# Altium footprint library Standard.PcbLib: 154 footprints (part 4 of 10)
Each footprint in its own frame and in the unit in brackets; x right, y up, seen from the top. Pads: shape width x height; smd on the part's side, far side on the other; paste and mask are expansions set on the pad; w line width, h text height; cw(c..) or ccw(c..) is an arc to the next point about the centre after c.
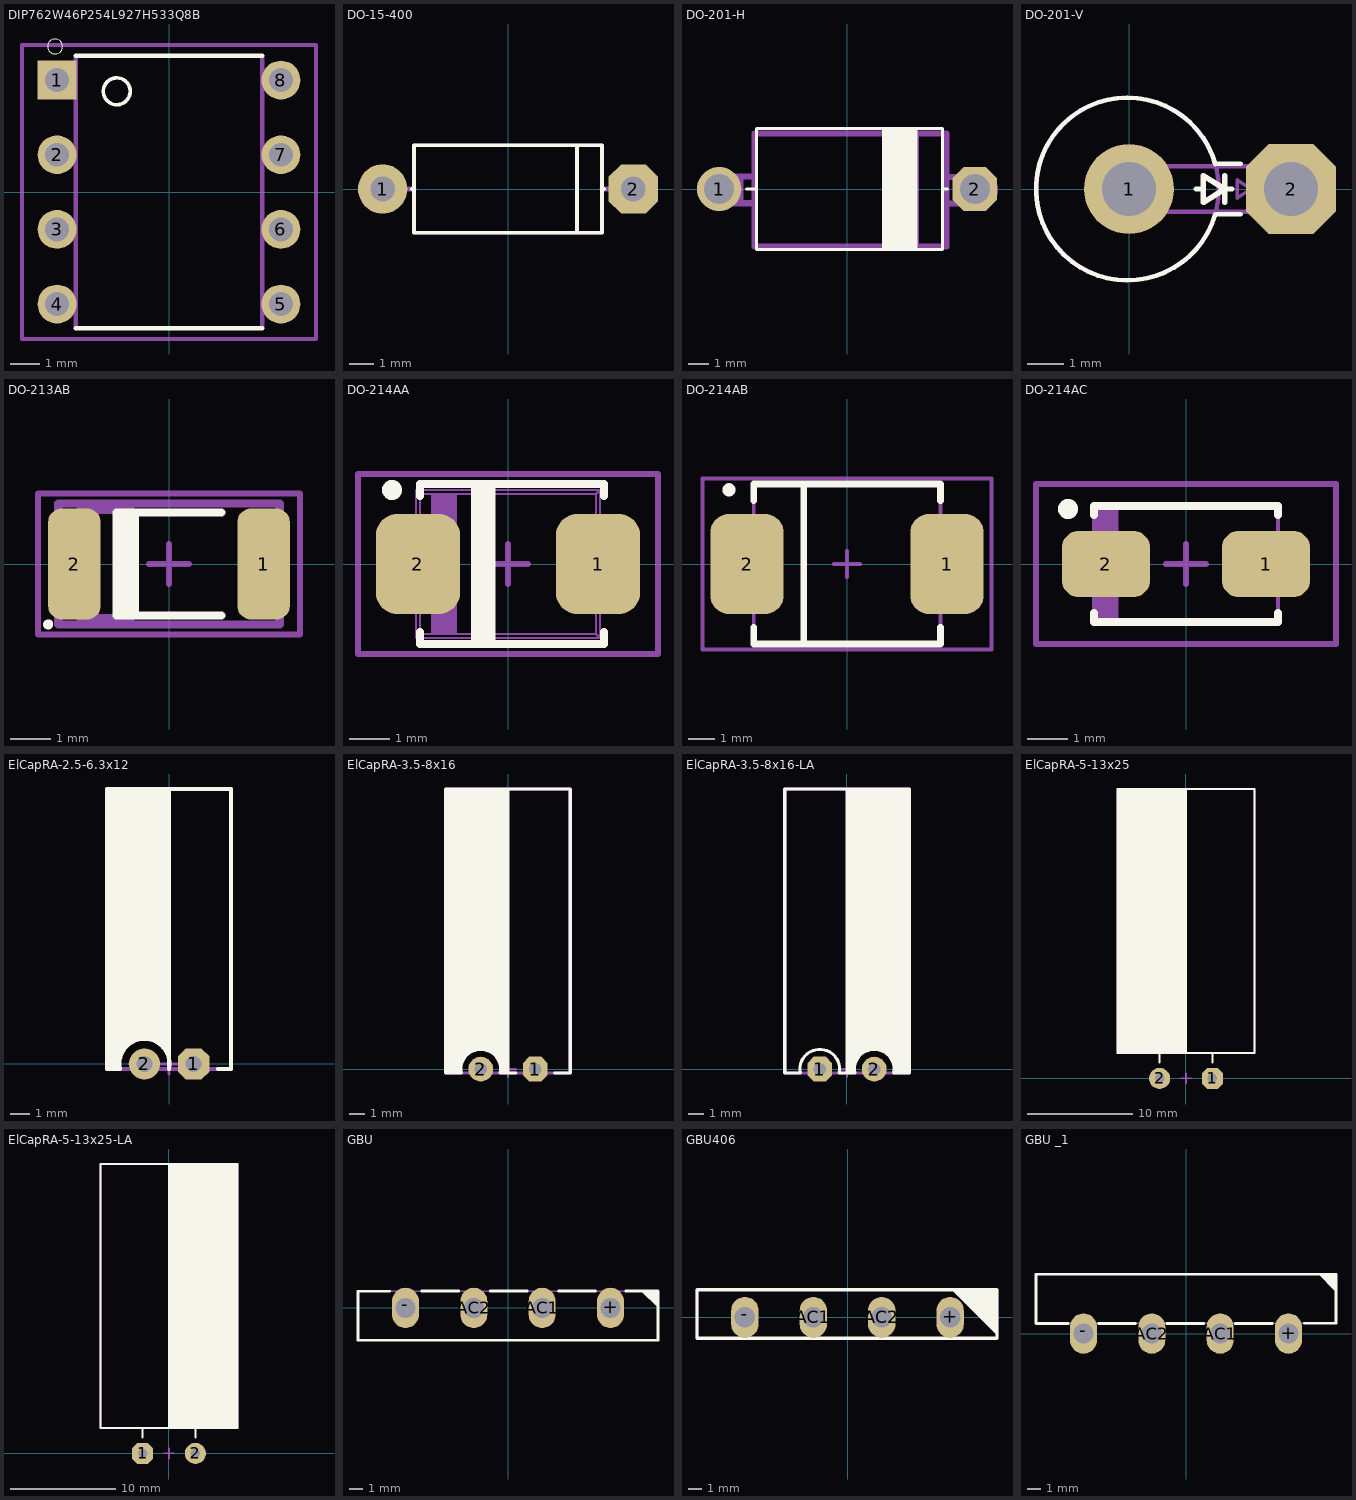
[diagram p3: the footprints below, top view; thin cyan lines are the x and y axes]

## DIP762W46P254L927H533Q8B [mil]
pads (8):
  rect 52x52 hole 32: 1(-150,150)
  round 52 hole 32: 2(-150,50) 3(-150,-50) 4(-150,-150) 5(150,-150) 6(150,-50) 7(150,50) 8(150,150)
Top Overlay:
  circle w0: c-152.6,195.04 r10
  circle w5: c-70,135 r18.03
  lines w6: -125,-182.48 125,-182.48 ; -125,182.48 125,182.48
Top Assembly:
  lines w6: -125,-182.48 -125,182.48 ; 125,-182.48 125,182.48
Top Component Outline:
  lines w5: -196.85,-196.85 196.85,-196.85 196.85,196.85 -196.85,196.85 -196.85,-196.85
3D body "step_temp.STEP": height 97.5, standoff -262.5, extent -155,-182.5 155,182.5

## DO-15-400 [mm]
pads (2):
  round 2 hole 1: 1(-5.08,0)
  oct 2x2 hole 1: 2(5.08,0)
Top Overlay:
  lines w0.15: -3.9,0 -3.81,0 ; 2.794,-1.778 2.794,1.778 ; 3.81,0 3.9,0 ; -3.81,-1.778 -3.81,1.778 3.81,1.778 3.81,-1.778 -3.81,-1.778
Top Assembly:
  circle w0.254: c-5.08,0 r0.381
  circle w0.254: c5.08,0 r0.381
  lines w0.125: 2.794,-1.778 2.794,1.778 ; -3.81,-1.778 3.81,-1.778 3.81,1.778 -3.81,1.778 -3.81,-1.778
  lines w0.2: -4.572,0 -3.81,0 ; 3.81,0 4.572,0
3D body "DO-15-400.STEP": height 4.78, standoff -1, extent -5.51,-1.782 5.51,1.783

## DO-201-H [mm]
pads (2):
  round 2.2 hole 1.5: 1(-6.35,0)
  oct 2.2x2.2 hole 1.5: 2(6.35,0)
Top Overlay:
  region: 1.75,3 3.5,3 3.5,-3 1.75,-3
  lines w0.15: -5,0 -4.5,0 ; 1.925,-2.794 1.925,2.794 ; 3.425,-2.794 3.425,2.794 ; 4.826,0 5,0 ; -4.5,-3 4.75,-3 4.75,3 -4.5,3 -4.5,-3
Top Assembly:
  lines w0.3: -6.3,-0.707 -5.294,-0.707 ; -6.294,-0.707 cw(c-6.294,-0.047) -6.294,0.613 ; -6.2,0.613 -5.294,0.613 ; -5.294,0.612 -5.294,-0.047 -5.294,-0.707 ; -4.594,-0.707 -5.294,-0.707 ; -4.594,0.613 -5.294,0.613 ; 4.994,-0.713 5.694,-0.713 ; 4.994,0.607 5.694,0.607 ; 6.6,-0.713 5.694,-0.713 ; 6.694,-0.713 ccw(c6.694,-0.053) 6.694,0.607 ; 6.7,0.607 5.694,0.607 ; -5.294,-0.707 -5.294,0.613 ; 1.936,-2.847 1.936,2.753 ; 1.936,-2.847 -4.594,-2.847 -4.594,2.753 1.936,2.753 ; 1.936,-2.847 3.436,-2.847 ; 1.936,2.753 3.436,2.753 ; 3.436,-2.847 3.436,2.753 ; 3.436,-2.847 4.936,-2.847 4.936,2.753 3.436,2.753 ; 5.694,-0.713 5.694,0.607 ; 5.694,-0.712 5.694,-0.053 5.694,0.607
3D body "DO-201-500.STEP": height 5.82, standoff -3, extent -7,-2.825 7,2.825

## DO-201-V [mm]
pads (2):
  round 2.5 hole 1.5: 1(0,0)
  oct 2.5x2.5 hole 1.5: 2(4.5,0)
Top Overlay:
  lines w0.125: 2.397,-0.699 cw(c-0.045,0) 2.399,0.692 ; 2.4,-0.7 3.1,-0.7 ; 2.4,0.7 3.1,0.7
  lines w0.15: 1.86,0 2.06,0 ; 2.06,-0.371 2.06,0.376 2.66,0 ; 2.065,-0.376 2.66,0 ; 2.66,-0.373 2.66,0.373 ; 2.86,0 2.66,0
Top Assembly:
  circle w0.125: c-0.045,0 r2.535
  lines w0.1: 3.389,-0.254 3.389,0.254 ; 3.008,-0.254 3.008,0.254 3.389,0 3.008,-0.254
  lines w0.125: 4.913,-0.635 ccw(c4.913,0) 4.913,0.635 ; 5.04,-0.635 -0.04,-0.635 cw(c-0.04,0) -0.04,0.635 5.04,0.635
3D body "DO-201-200 Ver.STEP": height 11.55, standoff -1.55, extent -2.84,-2.8 5.64,2.8

## DO-213AB [mm] "MELF Diode, 2-Leads, Body 5,00x2,50mm, IPC Medium Density"
height 2.6
pads (2):
  rrect50% 1.3x2.75 smd: 1(2.35,0) 2(-2.35,0)
Top Overlay:
  circle w0.15: c-3,-1.5 r0.05
  region: -0.75,1.275 -1.3,1.275 -1.3,-1.275 -0.75,-1.275
  lines w0.2: 1.3,-1.275 -1.3,-1.275 -1.3,1.275 1.3,1.275
Top Assembly:
  region: -1.75,1.5 -2.3,1.5 -2.3,-1.5 -1.75,-1.5
  region: -1.75,-1.25 -1,-1.25 -0.75,-1.5 -1.75,-1.5
  region: -1.75,1.25 -1,1.25 -0.75,1.5 -1.75,1.5
  lines w0.2: -2.75,-1.5 2.75,-1.5 2.75,1.5 -2.75,1.5 -2.75,-1.5
Top Component Outline:
  lines w0.15: -0.5,0 0.5,0 ; 0,-0.5 0,0.5 ; -3.25,-1.75 3.25,-1.75 3.25,1.75 -3.25,1.75 -3.25,-1.75
3D body "MELF.STEP": height 2.5, standoff 0, extent -2.616,-1.25 2.384,1.25

## DO-214AA [mm] "SMB, Molded Diode, 2-Leads, Body 4,33x3,65mm, IPC Medium Density"
height 2.4
pads (2):
  rrect50% 2.1x2.5 smd: 1(2.25,0) 2(-2.25,0)
Top Overlay:
  circle w0.25: c-2.9,1.85 r0.125
  rectangle: -0.93,-2 -0.311,2
  lines w0.2: -2.2,-1.7 -2.2,-2 2.4,-2 2.4,-1.7 ; -2.2,1.7 -2.2,2 2.4,2 2.4,1.7
Top Assembly:
  region: -1.3,1.75 -1.9,1.75 -1.9,-1.75 -1.3,-1.75
  lines w0.05: -2.4,-1 -2.3,-1 ; -2.4,-1 -2.65,-1 -2.65,1 -2.4,1 ; -2.4,-1 -2.4,1 ; -2.4,1 -2.3,1 ; -2.3,-1.85 -2.2,-1.75 ; -2.3,-1.85 -2.3,-1 ; -2.3,-1.85 2.3,-1.85 ; -2.3,-1 -2.3,1 ; -2.3,1 -2.3,1.85 ; -2.3,1.85 -2.2,1.75 ; -2.3,1.85 2.3,1.85 ; -2.2,-1.75 -2.2,1.75 ; -2.2,-1.75 -1.9,-1.75 ; -2.2,1.75 -1.9,1.75 ; -1.9,-1.75 -1.3,-1.75 ; -1.9,-1.75 -1.9,1.75 ; -1.9,1.75 -1.3,1.75 ; -1.3,-1.75 -1.3,1.75 ; -1.3,-1.75 2.2,-1.75 ; -1.3,1.75 2.2,1.75 ; 2.2,-1.75 2.3,-1.85 ; 2.2,-1.75 2.2,1.75 ; 2.2,1.75 2.3,1.85 ; 2.3,-1.85 2.3,-1 ; 2.3,-1 2.4,-1 ; 2.3,-1 2.3,1 ; 2.3,1 2.3,1.85 ; 2.3,1 2.4,1 ; 2.4,-1 2.65,-1 2.65,1 2.4,1 ; 2.4,-1 2.4,1
Top Component Outline:
  lines w0.15: -0.5,0 0.5,0 ; 0,-0.5 0,0.5 ; -3.75,-2.25 3.75,-2.25 3.75,2.25 -3.75,2.25 -3.75,-2.25
3D body "SMB (DO-214AA).STEP": height 2.2, standoff -0.05, extent -2.65,-1.85 2.65,1.85

## DO-214AB [mil] "SMC"
height 94.49
pads (2):
  rrect50% 110x150 smd: 1(150,0) 2(-150,0)
Top Overlay:
  circle w10: c-177.01,111.27 r4.92
  lines w10: -139.84,-95 -139.84,-120 140.16,-120 140.16,-95 ; -139.84,95 -139.84,120 140.16,120 140.16,95 ; -64.84,-120 -64.84,120
Top Assembly:
  lines w5.91: -64.84,-120 -64.84,120 ; -139.84,-120 140.16,-120 140.16,120 -139.84,120 -139.84,-120
Top Component Outline:
  lines w5.91: -19.69,0.08 19.68,0.08 ; 0,-19.61 0,19.76 ; -216.54,-127.95 216.54,-127.95 216.54,127.95 -216.54,127.95 -216.54,-127.95
3D body "User Library-DIOM8261X24.STEP": height 94.49, standoff 1.29, extent -160.04,-120 160.04,120.16

## DO-214AC [mm] "SMA 2-Leads, Body 2,55x5,00mm, IPC Medium Density"
height 1.1
pads (2):
  rrect50% 2.2x1.65 smd: 1(2,0) 2(-2,0)
Top Overlay:
  circle w0.25: c-2.95,1.375 r0.125
  lines w0.2: -2.3,-1.225 -2.3,-1.45 2.3,-1.45 2.3,-1.225 ; -2.3,1.225 -2.3,1.45 2.3,1.45 2.3,1.225
Top Assembly:
  rectangle: -2.3,-1.45 -1.681,1.45
  lines w0.1: -2.3,-1.45 2.3,-1.45 2.3,1.45 -2.3,1.45 -2.3,-1.45
Top Component Outline:
  lines w0.15: -0.5,0 0.5,0 ; 0,-0.5 0,0.5 ; -3.75,-2 3.75,-2 3.75,2 -3.75,2 -3.75,-2
3D body "User Library-S1G-1.step": height 2.7, standoff 0, extent -2.8,-1.475 2.8,1.475

## ElCapRA-2.5-6.3x12 [mm]
height 12
pads (2):
  oct 1.6x1.6 hole 0.8: 1(1.25,0)
  round 1.6 hole 0.8: 2(-1.25,0)
Top Overlay:
  region: 0,14 -3.15,14 -3.15,1.25 0,1.25
  rectangle: -3.125,-0.25 -2.5,1.5
  region: -2.725,1.625 -1.375,1.625 -3.063,-0.063
  region: -0.125,1.406 -0.868,1.406 0.061,0.478
  lines w0.2: 0,14.001 0,-0.25 ccw(c-1.25,0) -2.5,-0.25 -3.15,-0.25 -3.15,14 3.15,14 3.15,-0.25 2.5,-0.25
Top Assembly:
  lines w0.2: -3.151,-0.25 3.15,-0.25 3.15,14.001 -3.151,14.001 -3.151,-0.25
Top Component Outline:
  lines w0.15: -0.5,0 0.5,0 ; 0,-0.5 0,0.5
3D body "ElCapRA-2.5-6.3x12.step": height 6.4, standoff -3, extent -3.151,-0.249 3.15,14.001

## ElCapRA-3.5-8x16 [mm]
height 12
pads (2):
  oct 1.6x1.6 hole 0.8: 1(1.75,0)
  round 1.6 hole 0.8: 2(-1.75,0)
Top Overlay:
  region: 0,18 -4,18 -4,1.2 0,1.2
  region: 0,1.5 -0.5,1.5 -0.5,-0.25 0,-0.25
  rectangle: -4,-0.25 -3,1.5
  region: -0.5,1.5 -1.5,1.5 -0.25,0.25
  region: -3,1.5 -2,1.5 -3.25,0.25
  lines w0.2: 0,-0.25 0,18 ; 0.5,-0.25 -0.5,-0.25 ccw(c-1.75,0) -3,-0.25 ; 3,-0.25 4,-0.25 4,18 -4,18 ; -4,-0.25 -4,18 ; -4,-0.25 -3,-0.25 ; -4,-0.25 -4,18 ; -4,-0.25 -3,-0.25
Top Assembly:
  lines w0.2: -4,-0.25 -4,18 ; -4,-0.25 -4,18 ; -4,-0.25 4,-0.25 4,18 -4,18
Top Component Outline:
  lines w0.15: -0.5,0 0.5,0 ; 0,-0.5 0,0.5
3D body "ElCapRA-3.5-8x16.step": height 8.1, standoff -3, extent -4.001,-0.249 4,18.001

## ElCapRA-3.5-8x16-LA [mm]
height 12
pads (2):
  oct 1.6x1.6 hole 0.8: 1(-1.75,0)
  round 1.6 hole 0.8: 2(1.75,0)
Top Overlay:
  rectangle: 0,1.2 4,18
  rectangle: 0,-0.25 0.5,1.5
  region: 4,1.5 3,1.5 3,-0.25 4,-0.25
  region: 0.5,1.5 1.5,1.5 0.25,0.25
  region: 3,1.5 2,1.5 3.25,0.25
  lines w0.2: -4,-0.25 -4,18 ; -4,-0.25 -3,-0.25 ; -4,-0.25 -4,18 ; -4,-0.25 -3,-0.25 ; -4,18 4,18 ; -3,-0.25 cw(c-1.75,0) -0.5,-0.25 0.5,-0.25 cw(c1.75,0) 3,-0.25 ; 3,-0.25 4,-0.25 ; 3,-0.25 4,-0.25 ; 3,-0.25 4,-0.25 ; 4,-0.25 4,18 ; 4,-0.25 4,18 ; 4,-0.25 4,18 ; 0,-0.25 0,18 0,-0.25
Top Assembly:
  lines w0.2: -4,-0.25 -4,18 ; -4,-0.25 -4,18 ; -4,-0.25 4,-0.25 4,18 -4,18
Top Component Outline:
  lines w0.15: -0.5,0 0.5,0 ; 0,-0.5 0,0.5
3D body "ElCapLA-3.5-8x16.step": height 8.1, standoff -3, extent -4,-0.249 4.001,18.001

## ElCapRA-5-13x25 [mm]
height 25
pads (2):
  oct 2x2 hole 0.9: 1(2.5,0)
  round 2 hole 0.9: 2(-2.5,0)
Top Overlay:
  rectangle: -6.5,2.401 0,27.401
  lines w0.2: -2.5,1.5 -2.5,2.401 ; 0.001,2.401 0.001,27.401 ; 2.5,1.5 2.5,2.401 ; -6.5,2.401 6.501,2.401 6.501,27.401 -6.5,27.401 -6.5,2.401
Top Assembly:
  lines w0.2: -6.5,2.401 6.501,2.401 6.501,27.401 -6.5,27.401 -6.5,2.401
Top Component Outline:
  lines w0.15: -0.5,0 0.5,0 ; 0,-0.5 0,0.5
3D body "ElCapRA-5.0-13x25.step": height 13.1, standoff -3, extent -6.501,-0.299 6.5,27.401

## ElCapRA-5-13x25-LA [mm]
height 25
pads (2):
  oct 2x2 hole 0.9: 1(-2.5,0)
  round 2 hole 0.9: 2(2.5,0)
Top Overlay:
  rectangle: 0.001,2.401 6.5,27.401
  lines w0.2: -2.5,1.5 -2.5,2.401 ; 0.001,2.401 0.001,27.401 ; 2.5,1.5 2.5,2.401 ; -6.5,2.401 -6.5,27.401 6.501,27.401 6.501,2.401 -6.5,2.401
Top Assembly:
  lines w0.2: -6.5,2.401 -6.5,27.401 6.501,27.401 6.501,2.401 -6.5,2.401
Top Component Outline:
  lines w0.15: -0.5,0 0.5,0 ; 0,-0.5 0,0.5
3D body "ElCapLA-5.0-13x25.step": height 13.1, standoff -3, extent -6.5,-0.299 6.501,27.401

## GBU [mm]
pads (4):
  oval 2x3 hole 1.5: +(7.62,0) -(-7.62,0) AC1(2.54,0) AC2(-2.54,0)
Top Overlay:
  region: 9.91,1.25 11.15,1.25 11.15,0.06 11.125,0.035
  lines w0.2: -8.8,1.23 -11.15,1.23 -11.15,-2.41 11.15,-2.41 11.15,1.25 8.758,1.25 ; -6.41,1.25 -3.66,1.25 ; -1.33,1.25 1.42,1.25 ; 3.75,1.25 6.5,1.25
Top Assembly:
  region: 11.15,1.25 11.15,0.3 11.1,0.3 10.15,1.25
  lines w0.1: -11.15,-2.41 -11.15,1.25 11.15,1.25 11.15,-2.41 10.91,-2.41 -11.15,-2.41
3D body "GBU.stp": height 22, standoff -4.55, extent -11.15,-2.41 11.15,1.25

## GBU406 [mm]
pads (4):
  oval 2x3 hole 1.5: +(7.5,0) -(-7.5,0) AC1(-2.5,0) AC2(2.5,0)
Top Overlay:
  region: 10.922,2.032 10.922,-1.27 7.62,2.032
  lines w0.254: -11,-1.524 -11,2.032 6.858,2.032 10.922,2.032 10.922,-1.524 -11,-1.524
Top Assembly:
  region: 10.922,2.032 10.922,-1.27 7.62,2.032
  lines w0.2: -11,-1.524 -11,2.032 10.922,2.032 10.922,-1.524 -11,-1.524
3D body "User Library-Silicon Bridge Rectifiers GBU406.step": height 25.25, standoff -11.25, extent -11,-1.524 11,2.026

## GBU _1 [mm]
pads (4):
  oval 2x3 hole 1.5: +(7.62,0) -(-7.62,0) AC1(2.54,0) AC2(-2.54,0)
Top Overlay:
  region: 9.86,4.4 11.1,4.4 11.1,3.21 11.075,3.185
  lines w0.2: -8.758,0.75 -11.15,0.75 -11.15,4.41 11.15,4.41 11.15,0.77 8.8,0.77 ; -6.5,0.75 -3.75,0.75 ; -1.42,0.75 1.33,0.75 ; 3.66,0.75 6.41,0.75
Top Assembly:
  region: 11.15,4.41 11.15,3.46 11.1,3.46 10.15,4.41
  lines w0.1: -11.15,0.75 11.15,0.75 11.15,4.41 -10.91,4.41 -11.15,4.41 -11.15,0.75
3D body "User Library-GBU10A-1.STEP": height 23.8, standoff 5, extent -11.15,0.75 11.15,4.36